# Altium footprint library YQPOWER.PcbLib: 215 footprints (part 14 of 14)
Each footprint in its own frame and in the unit in brackets; x right, y up, seen from the top. Pads: shape width x height; smd on the part's side, far side on the other; paste and mask are expansions set on the pad; w line width, h text height; cw(c..) or ccw(c..) is an arc to the next point about the centre after c.
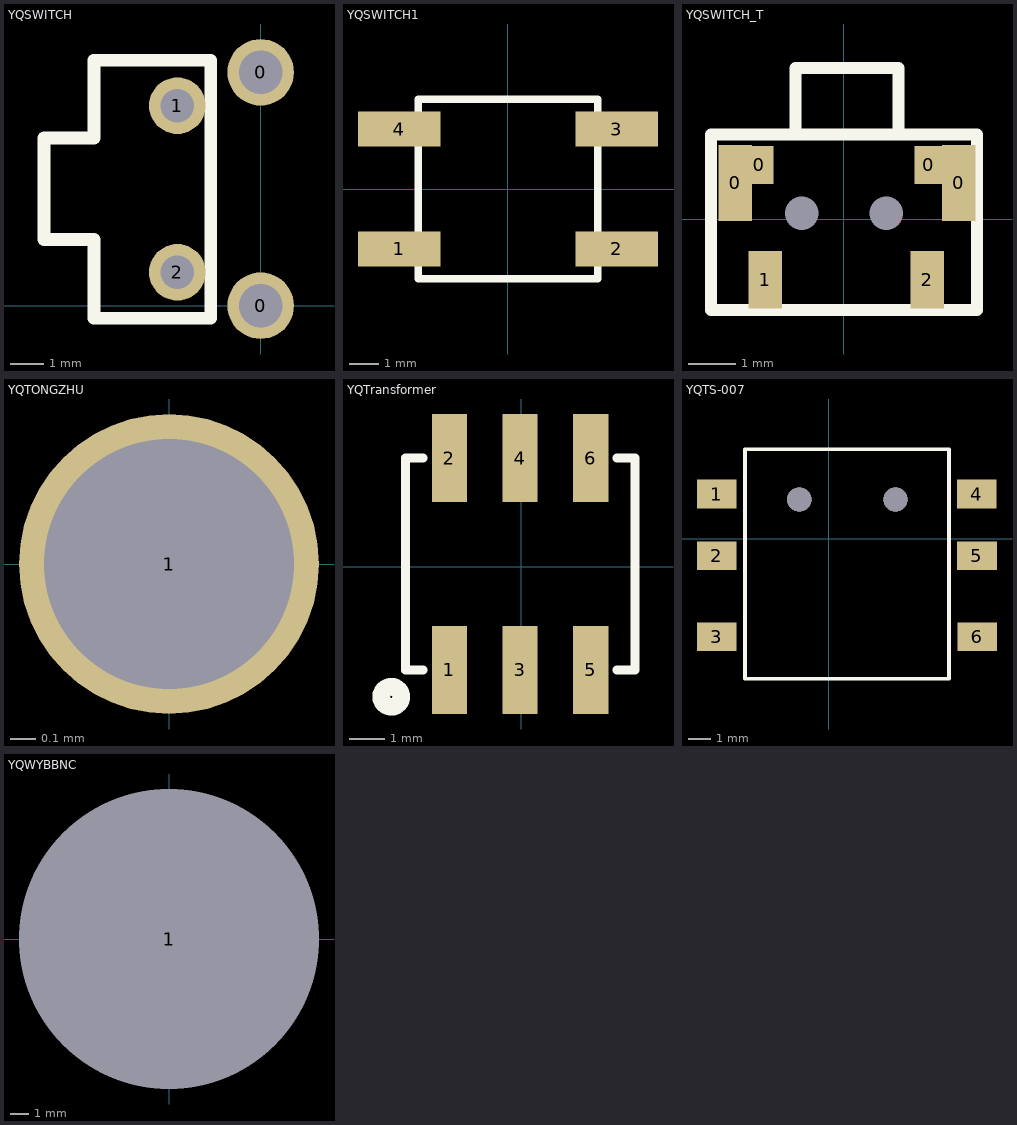
[diagram p13: the footprints below, top view; thin cyan lines are the x and y axes]

## YQSWITCH [mm]
height 4.3
pads (4):
  round 2 hole 1.3: 0(0,0) 0(0,7)
  round 1.7 hole 1: 1(-2.5,6) 2(-2.5,1)
Top Overlay:
  lines w0.381: -6.5,1.985 -6.5,5.033 -5,5.033 -5,7.366 -1.5,7.366 -1.5,-0.381 -5,-0.381 -5,1.985 -6.5,1.985

## YQSWITCH1 [mm] "不包脚"
pads (4):
  rect 2.8x1.2 smd: 1(-3.683,-2.032) 2(3.683,-2.032) 3(3.683,2.032) 4(-3.683,2.032)
Top Overlay:
  lines w0.254: -3.048,-3.048 3.048,-3.048 3.048,-0.254 3.048,3.048 -3.048,3.048 -3.048,-3.048

## YQSWITCH_T [mm]
pads (8):
  rect 0.7x1.6 smd: 0(-2.286,0.762) 0(2.413,0.762)
  rect 0.6x0.8 smd: 0(-1.778,1.143) 0(1.778,1.143)
  round 0 hole 0.7: 0(-0.889,0.127) 0(0.889,0.127)
  rect 0.7x1.2 smd: 1(-1.651,-1.27) 2(1.749,-1.27)
Top Overlay:
  lines w0.254: -1.016,1.778 -1.016,3.175 1.143,3.175 1.143,1.778 ; -2.794,-1.905 -2.794,1.778 2.794,1.778 2.794,-1.905 -2.794,-1.905

## YQTONGZHU [mm]
pads (1):
  round 1.2 hole 1: 1(0,0)

## YQTransformer [mm]
pads (6):
  rect 1x2.5 smd: 1(-2.032,-2.921) 2(-2.032,3.079) 3(-0.032,-2.921) 4(-0.032,3.079) 5(1.968,-2.921) 6(1.968,3.079)
Top Overlay:
  circle w0.5: c-3.683,-3.683 r0.284
  lines w0.254: -2.782,-2.921 -3.282,-2.921 -3.282,3.079 -2.782,3.079 ; 2.718,-2.921 3.218,-2.921 3.218,3.079 2.718,3.079

## YQTS-007 [mm]
pads (6):
  rect 1.8x1.3 smd: 1(-5.08,2.032) 2(-5.08,-0.762) 3(-5.08,-4.445) 4(6.706,2.032) 5(6.72,-0.762) 6(6.731,-4.445)
via 3.023,1.778 diameter 1.1 hole 1.1
via -1.346,1.778 diameter 1.1 hole 1.1
Top Overlay:
  lines w0.178: -3.81,-6.35 5.461,-6.35 5.461,4.064 -3.81,4.064 -3.81,-6.35

## YQWYBBNC [mm] "5mm high,5mm D,1mm hole"
pads (1):
  round 2 hole 16: 1(0,0)